# Altium footprint library kalios.PcbLib: 404 footprints (part 24 of 26)
Each footprint in its own frame and in the unit in brackets; x right, y up, seen from the top. Pads: shape width x height; smd on the part's side, far side on the other; paste and mask are expansions set on the pad; w line width, h text height; cw(c..) or ccw(c..) is an arc to the next point about the centre after c.
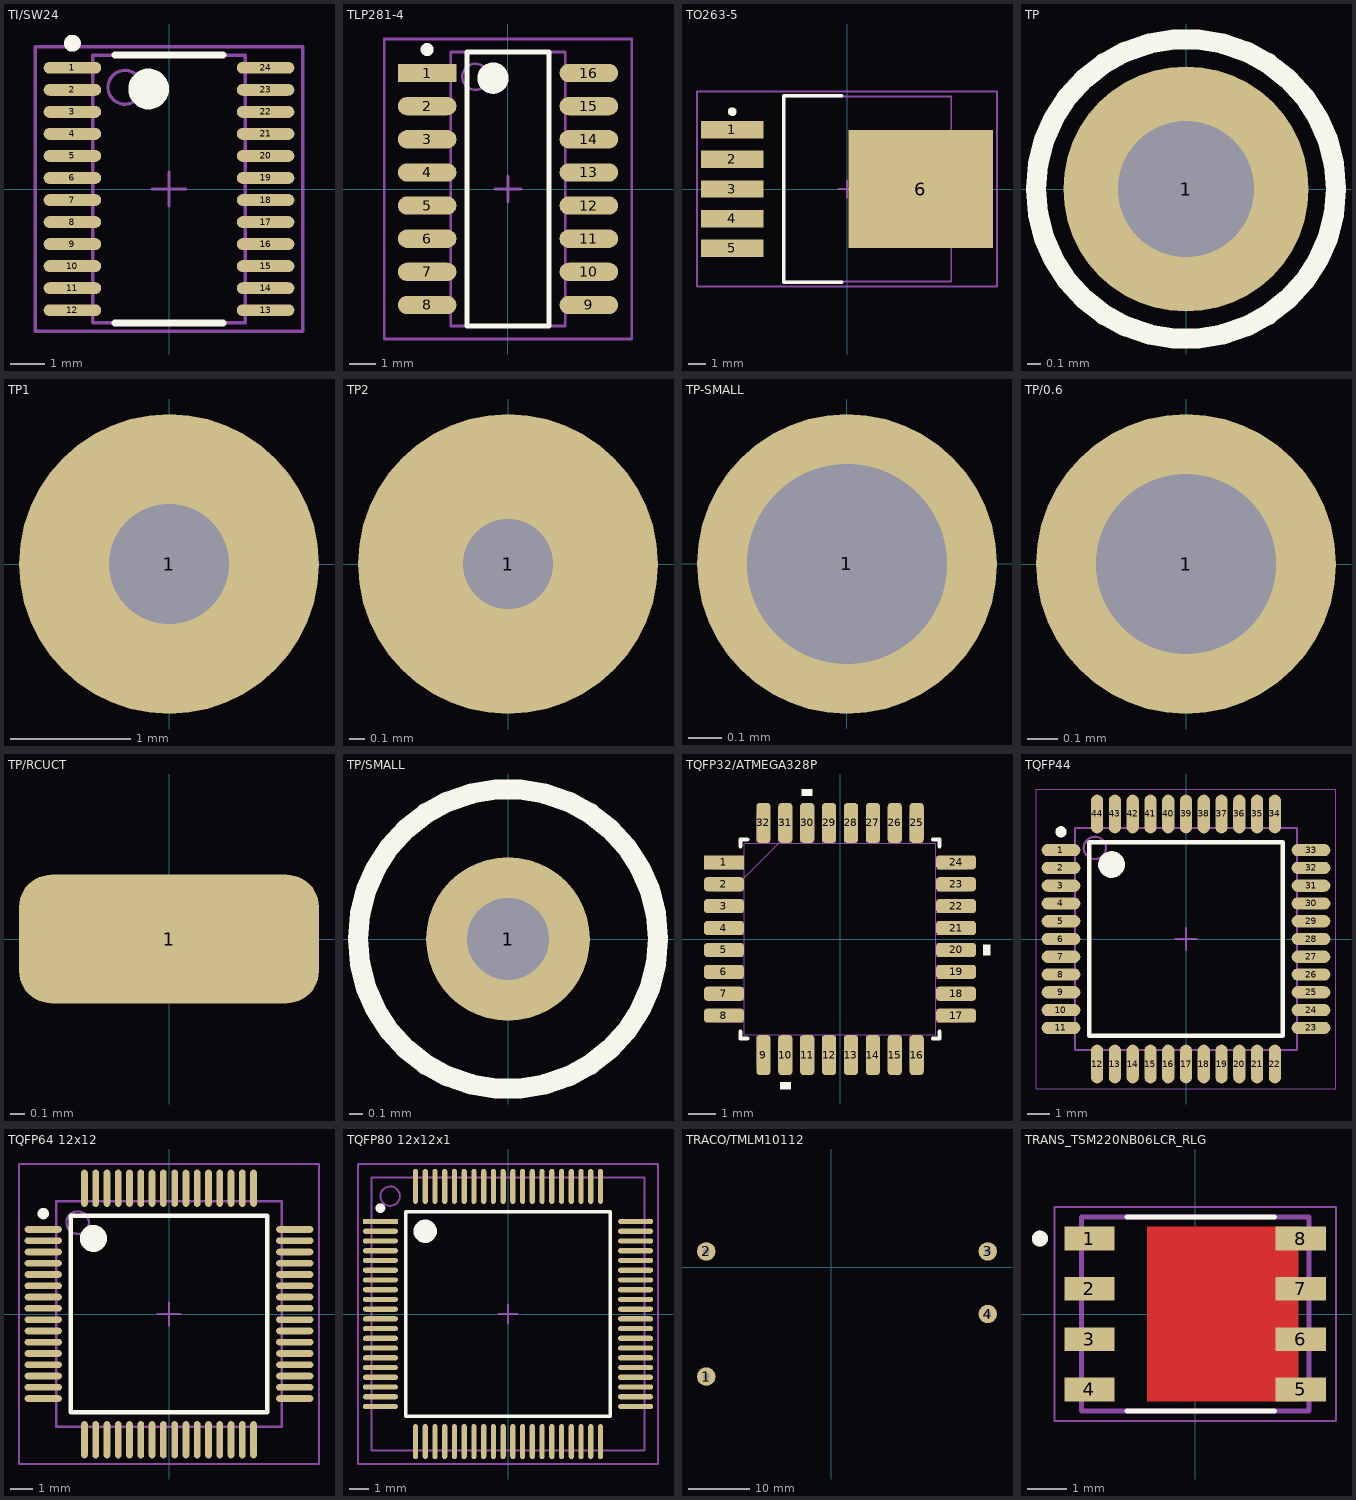
[diagram p23: the footprints below, top view; thin cyan lines are the x and y axes]

## TI/SW24 [mm] "TSOP, 24-Leads, Body 7.9x4.5mm (max), Pitch 0.65mm, IPC Medium Density"
height 1.2
pads (24):
  oval 1.7x0.35 smd: 1(-2.85,3.575) 2(-2.85,2.925) 3(-2.85,2.275) 4(-2.85,1.625) 5(-2.85,0.975) 6(-2.85,0.325) 7(-2.85,-0.325) 8(-2.85,-0.975) 9(-2.85,-1.625) 10(-2.85,-2.275) 11(-2.85,-2.925) 12(-2.85,-3.575) 13(2.85,-3.575) 14(2.85,-2.925) 15(2.85,-2.275) 16(2.85,-1.625) 17(2.85,-0.975) 18(2.85,-0.325) 19(2.85,0.325) 20(2.85,0.975) 21(2.85,1.625) 22(2.85,2.275) 23(2.85,2.925) 24(2.85,3.575)
Top Overlay:
  circle w0.25: c-2.85,4.3 r0.125
  circle w0.6: c-0.6,2.95 r0.3
  lines w0.2: -1.6,-3.95 1.6,-3.95 ; -1.6,3.95 1.6,3.95
Top 3D Body:
  circle w0.1: c-1.3,3 r0.5
  lines w0.1: -2.25,-3.95 -2.25,3.95 2.25,3.95 2.25,-3.95 -2.25,-3.95
Top Courtyard:
  lines w0.1: -0.5,0 0.5,0 ; 0,-0.5 0,0.5 ; -3.95,-4.2 -3.95,4.2 3.95,4.2 3.95,-4.2 -3.95,-4.2
Top Designator:
  text ".Designator" at -7.618,-0.358 h1.52
3D body "User Library-AD8400 TSSOP.STEP": height 1.18, standoff 0, extent -3.2,-3.953 3.207,3.937

## TLP281-4 [mm] "SOIC, 16-Leads, Body 10.5x4.4mm (max), Pitch 1.27mm, IPC Low Density"
height 2
pads (16):
  rect 2.25x0.7 smd: 1(-3.1,4.445)
  oval 2.25x0.7 smd: 2(-3.1,3.175) 3(-3.1,1.905) 4(-3.1,0.635) 5(-3.1,-0.635) 6(-3.1,-1.905) 7(-3.1,-3.175) 8(-3.1,-4.445) 9(3.1,-4.445) 10(3.1,-3.175) 11(3.1,-1.905) 12(3.1,-0.635) 13(3.1,0.635) 14(3.1,1.905) 15(3.1,3.175) 16(3.1,4.445)
Top Overlay:
  circle w0.6: c-0.575,4.25 r0.3
  circle w0.25: c-3.1,5.345 r0.125
  lines w0.2: -1.575,-5.25 1.575,-5.25 1.575,5.25 -1.575,5.25 -1.575,-5.25
Top 3D Body:
  circle w0.1: c-1.25,4.3 r0.5
  lines w0.1: -2.2,-5.25 2.2,-5.25 2.2,5.25 -2.2,5.25 -2.2,-5.25
Top Courtyard:
  lines w0.1: -0.5,0 0.5,0 ; 0,-0.5 0,0.5 ; -4.75,-5.75 4.75,-5.75 4.75,5.75 -4.75,5.75 -4.75,-5.75
Top Designator:
  text ".Designator" at -7.618,-0.508 h1.52
3D body "TLP281-4.STEP": height 1.9, standoff 0, extent -3.45,-5.15 3.55,5.15

## TO263-5 [mm] "D2PAK, 6-Pads, Body 9.6x10.7mm (max), IPC Medium Density"
height 0.58
pads (6):
  rect 3.6x1 smd: 1(-6.6,3.4) 2(-6.6,1.7) 3(-6.6,0) 4(-6.6,-1.7) 5(-6.6,-3.4)
  rect 8.3x6.8 smd: 6(4.25,0)
Top Overlay:
  circle w0.25: c-6.6,4.45 r0.125
  lines w0.2: -0.3,-5.35 -3.65,-5.35 -3.65,5.35 -0.3,5.35
Top 3D Body:
  lines w0.1: -3.65,-5.325 -3.65,5.325 6,5.325 6,-5.325 -3.65,-5.325
Top Courtyard:
  lines w0.1: -0.5,0 0.5,0 ; 0,-0.5 0,0.5 ; -8.625,-5.6 -8.625,5.6 8.625,5.6 8.625,-5.6 -8.625,-5.6
Top Designator:
  text ".Designator" at -7.618,-0.508 h1.52
3D body "TO263-5.STEP": height 4.78, standoff -0.02, extent -8.063,-5 7.607,5

## TP [mm]
pads (1):
  round 1.8 hole 1: 1(0,0)
Top Overlay:
  circle w0.15: c0,0 r1.1
Top Designator:
  text ".Designator" at -7.618,-0.508 h1.52

## TP1 [mm]
pads (1):
  round 2.5 hole 1: 1(0,0)
Top Designator:
  text ".Designator" at -7.618,-0.508 h1.52

## TP2 [mm]
pads (1):
  round 2 hole 0.6: 1(0,0)
Top Designator:
  text ".Designator" at -7.618,-0.508 h1.52

## TP-SMALL [mm]
pads (1):
  round 0.9 hole 0.6: 1(0,0)
Top Designator:
  text ".Designator" at -7.618,-0.508 h1.52

## TP/0.6 [mm]
pads (1):
  round 1 hole 0.6: 1(0,0)
Top Designator:
  text ".Designator" at -7.618,-0.508 h1.52

## TP/RCUCT [mm]
pads (1):
  rrect50% 2.1x0.9 smd: 1(0,0)
3D body "RCU.STEP": height 1.15, standoff 0, extent -0.8,-0.4 0.8,0.4

## TP/SMALL [mm]
pads (1):
  round 1.2 hole 0.6: 1(0,0)
Top Overlay:
  circle w0.15: c0,0 r1.1
Top Designator:
  text ".Designator" at -7.618,-0.508 h1.52

## TQFP32/ATMEGA328P [mm]
pads (32):
  rect 1.462x0.517 smd: 1(-4.242,2.8)
  rrect50% 1.462x0.517 smd: 2(-4.242,2) 3(-4.242,1.2) 4(-4.242,0.4) 5(-4.242,-0.4) 6(-4.242,-1.2) 7(-4.242,-2) 8(-4.242,-2.8) 17(4.242,-2.8) 18(4.242,-2) 19(4.242,-1.2) 20(4.242,-0.4) 21(4.242,0.4) 22(4.242,1.2) 23(4.242,2) 24(4.242,2.8)
  rrect50% 0.517x1.462 smd: 9(-2.8,-4.242) 10(-2,-4.242) 11(-1.2,-4.242) 12(-0.4,-4.242) 13(0.4,-4.242) 14(1.2,-4.242) 15(2,-4.242) 16(2.8,-4.242) 25(2.8,4.242) 26(2,4.242) 27(1.2,4.242) 28(0.4,4.242) 29(-0.4,4.242) 30(-1.2,4.242) 31(-2,4.242) 32(-2.8,4.242)
Top Overlay:
  region: -1.81,-5.227 -2.191,-5.227 -2.191,-5.481 -1.81,-5.481
  region: 5.227,-0.209 5.481,-0.209 5.481,-0.59 5.227,-0.59
  region: -1.01,5.227 -1.391,5.227 -1.391,5.481 -1.01,5.481
  lines w0.152: -3.632,-3.391 -3.632,-3.632 -3.391,-3.632 ; -3.632,3.391 -3.632,3.632 -3.391,3.632 ; 3.391,-3.632 3.632,-3.632 3.632,-3.391 ; 3.391,3.632 3.632,3.632 3.632,3.391
Top 3D Body:
  lines w0.025: -3.505,2.235 -2.235,3.505 ; -4.623,-3.029 -4.623,-2.571 -3.505,-2.571 -3.505,-3.029 -4.623,-3.029 ; -4.623,-2.229 -4.623,-1.771 -3.505,-1.771 -3.505,-2.229 -4.623,-2.229 ; -4.623,-1.429 -4.623,-0.971 -3.505,-0.971 -3.505,-1.429 -4.623,-1.429 ; -4.623,-0.629 -4.623,-0.171 -3.505,-0.171 -3.505,-0.629 -4.623,-0.629 ; -4.623,0.171 -4.623,0.629 -3.505,0.629 -3.505,0.171 -4.623,0.171 ; -4.623,0.971 -4.623,1.429 -3.505,1.429 -3.505,0.971 -4.623,0.971 ; -4.623,1.771 -4.623,2.229 -3.505,2.229 -3.505,1.771 -4.623,1.771 ; -4.623,2.571 -4.623,3.029 -3.505,3.029 -3.505,2.571 -4.623,2.571 ; -3.505,-3.505 3.505,-3.505 3.505,3.505 -3.505,3.505 -3.505,-3.505 ; -3.029,-4.623 -3.029,-3.505 -2.571,-3.505 -2.571,-4.623 -3.029,-4.623 ; -3.029,3.505 -2.571,3.505 -2.571,4.623 -3.029,4.623 -3.029,3.505 ; -2.229,-4.623 -2.229,-3.505 -1.771,-3.505 -1.771,-4.623 -2.229,-4.623 ; -2.229,3.505 -1.771,3.505 -1.771,4.623 -2.229,4.623 -2.229,3.505 ; -1.429,-4.623 -1.429,-3.505 -0.971,-3.505 -0.971,-4.623 -1.429,-4.623 ; -1.429,3.505 -0.971,3.505 -0.971,4.623 -1.429,4.623 -1.429,3.505 ; -0.629,-4.623 -0.629,-3.505 -0.171,-3.505 -0.171,-4.623 -0.629,-4.623 ; -0.629,3.505 -0.171,3.505 -0.171,4.623 -0.629,4.623 -0.629,3.505 ; 0.171,-4.623 0.171,-3.505 0.629,-3.505 0.629,-4.623 0.171,-4.623 ; 0.171,3.505 0.629,3.505 0.629,4.623 0.171,4.623 0.171,3.505 ; 0.971,-4.623 0.971,-3.505 1.429,-3.505 1.429,-4.623 0.971,-4.623 ; 0.971,3.505 1.429,3.505 1.429,4.623 0.971,4.623 0.971,3.505 ; 1.771,-4.623 1.771,-3.505 2.229,-3.505 2.229,-4.623 1.771,-4.623 ; 1.771,3.505 2.229,3.505 2.229,4.623 1.771,4.623 1.771,3.505 ; 2.571,-4.623 2.571,-3.505 3.029,-3.505 3.029,-4.623 2.571,-4.623 ; 2.571,3.505 3.029,3.505 3.029,4.623 2.571,4.623 2.571,3.505 ; 3.505,-3.029 3.505,-2.571 4.623,-2.571 4.623,-3.029 3.505,-3.029 ; 3.505,-2.229 3.505,-1.771 4.623,-1.771 4.623,-2.229 3.505,-2.229 ; 3.505,-1.429 3.505,-0.971 4.623,-0.971 4.623,-1.429 3.505,-1.429 ; 3.505,-0.629 3.505,-0.171 4.623,-0.171 4.623,-0.629 3.505,-0.629 ; 3.505,0.171 3.505,0.629 4.623,0.629 4.623,0.171 3.505,0.171 ; 3.505,0.971 3.505,1.429 4.623,1.429 4.623,0.971 3.505,0.971 ; 3.505,1.771 3.505,2.229 4.623,2.229 4.623,1.771 3.505,1.771 ; 3.505,2.571 3.505,3.029 4.623,3.029 4.623,2.571 3.505,2.571
Top Designator:
  text ".Designator" at -7.414,-0.508 h1.52
3D body "tqfp32.STEP": height 1.11, standoff 0, extent -4.794,-4.806 4.806,4.794

## TQFP44 [mm] "TQFP, 44-Leads, Body 10.00x10.00mm, Pitch 0.80mm, IPC Medium Density"
height 1.2
pads (44):
  oval 1.75x0.55 smd: 1(-5.625,4) 2(-5.625,3.2) 3(-5.625,2.4) 4(-5.625,1.6) 5(-5.625,0.8) 6(-5.625,0) 7(-5.625,-0.8) 8(-5.625,-1.6) 9(-5.625,-2.4) 10(-5.625,-3.2) 11(-5.625,-4) 23(5.625,-4) 24(5.625,-3.2) 25(5.625,-2.4) 26(5.625,-1.6) 27(5.625,-0.8) 28(5.625,0) 29(5.625,0.8) 30(5.625,1.6) 31(5.625,2.4) 32(5.625,3.2) 33(5.625,4)
  oval 0.55x1.75 smd: 12(-4,-5.625) 13(-3.2,-5.625) 14(-2.4,-5.625) 15(-1.6,-5.625) 16(-0.8,-5.625) 17(0,-5.625) 18(0.8,-5.625) 19(1.6,-5.625) 20(2.4,-5.625) 21(3.2,-5.625) 22(4,-5.625) 34(4,5.625) 35(3.2,5.625) 36(2.4,5.625) 37(1.6,5.625) 38(0.8,5.625) 39(0,5.625) 40(-0.8,5.625) 41(-1.6,5.625) 42(-2.4,5.625) 43(-3.2,5.625) 44(-4,5.625)
Top Overlay:
  circle w0.6: c-3.35,3.35 r0.3
  circle w0.25: c-5.625,4.825 r0.125
  lines w0.2: -4.35,-4.35 4.35,-4.35 4.35,4.35 -4.35,4.35 -4.35,-4.35
Top 3D Body:
  circle w0.1: c-4.1,4.1 r0.5
  lines w0.1: -5,-5 5,-5 5,5 -5,5 -5,-5
Top Courtyard:
  lines w0.05: -6.75,-6.75 6.75,-6.75 6.75,6.75 -6.75,6.75 -6.75,-6.75
  lines w0.1: -0.5,0 0.5,0 ; 0,-0.5 0,0.5
Top Designator:
  text ".Designator" at -7.618,-0.508 h1.52
3D body "User Library-TQFP44-2 (1).STEP": height 1.1, standoff -0.05, extent -6.012,-6.012 6.012,6.012

## TQFP64 12x12 [mm] "TSQFP, 64-Leads, Body 12.0x12.0mm (max), Pitch 0.50mm, IPC Medium Density"
height 1.2
pads (64):
  oval 1.65x0.3 smd: 1(-5.575,3.75) 2(-5.575,3.25) 3(-5.575,2.75) 4(-5.575,2.25) 5(-5.575,1.75) 6(-5.575,1.25) 7(-5.575,0.75) 8(-5.575,0.25) 9(-5.575,-0.25) 10(-5.575,-0.75) 11(-5.575,-1.25) 12(-5.575,-1.75) 13(-5.575,-2.25) 14(-5.575,-2.75) 15(-5.575,-3.25) 16(-5.575,-3.75) 33(5.575,-3.75) 34(5.575,-3.25) 35(5.575,-2.75) 36(5.575,-2.25) 37(5.575,-1.75) 38(5.575,-1.25) 39(5.575,-0.75) 40(5.575,-0.25) 41(5.575,0.25) 42(5.575,0.75) 43(5.575,1.25) 44(5.575,1.75) 45(5.575,2.25) 46(5.575,2.75) 47(5.575,3.25) 48(5.575,3.75)
  oval 0.3x1.65 smd: 17(-3.75,-5.575) 18(-3.25,-5.575) 19(-2.75,-5.575) 20(-2.25,-5.575) 21(-1.75,-5.575) 22(-1.25,-5.575) 23(-0.75,-5.575) 24(-0.25,-5.575) 25(0.25,-5.575) 26(0.75,-5.575) 27(1.25,-5.575) 28(1.75,-5.575) 29(2.25,-5.575) 30(2.75,-5.575) 31(3.25,-5.575) 32(3.75,-5.575) 49(3.75,5.575) 50(3.25,5.575) 51(2.75,5.575) 52(2.25,5.575) 53(1.75,5.575) 54(1.25,5.575) 55(0.75,5.575) 56(0.25,5.575) 57(-0.25,5.575) 58(-0.75,5.575) 59(-1.25,5.575) 60(-1.75,5.575) 61(-2.25,5.575) 62(-2.75,5.575) 63(-3.25,5.575) 64(-3.75,5.575)
Top Overlay:
  circle w0.25: c-5.575,4.45 r0.125
  circle w0.6: c-3.35,3.35 r0.3
  lines w0.2: -4.35,-4.35 -4.35,4.35 4.35,4.35 4.35,-4.35 -4.35,-4.35
Top 3D Body:
  circle w0.1: c-4.05,4.05 r0.5
  lines w0.1: -5,-5 -5,5 5,5 5,-5 -5,-5
Top Courtyard:
  lines w0.1: -0.5,0 0.5,0 ; 0,-0.5 0,0.5 ; -6.65,-6.65 -6.65,6.65 6.65,6.65 6.65,-6.65 -6.65,-6.65
Top Designator:
  text ".Designator" at -7.618,-0.508 h1.52
3D body "User Library-TQFP-64-1.STEP": height 1.05, standoff -0.01, extent -6,-6 6,6

## TQFP80 12x12x1 [mm] "TQFP, 80-Leads, Body 14x14mm, Pitch 0.50mm, IPC Medium Density"
height 1.1
pads (80):
  rect 1.8x0.27 smd: 1(-6.55,4.75)
  oval 1.8x0.27 smd: 2(-6.55,4.25) 3(-6.55,3.75) 4(-6.55,3.25) 5(-6.55,2.75) 6(-6.55,2.25) 7(-6.55,1.75) 8(-6.55,1.25) 9(-6.55,0.75) 10(-6.55,0.25) 11(-6.55,-0.25) 12(-6.55,-0.75) 13(-6.55,-1.25) 14(-6.55,-1.75) 15(-6.55,-2.25) 16(-6.55,-2.75) 17(-6.55,-3.25) 18(-6.55,-3.75) 19(-6.55,-4.25) 20(-6.55,-4.75) 41(6.55,-4.75) 42(6.55,-4.25) 43(6.55,-3.75) 44(6.55,-3.25) 45(6.55,-2.75) 46(6.55,-2.25) 47(6.55,-1.75) 48(6.55,-1.25) 49(6.55,-0.75) 50(6.55,-0.25) 51(6.55,0.25) 52(6.55,0.75) 53(6.55,1.25) 54(6.55,1.75) 55(6.55,2.25) 56(6.55,2.75) 57(6.55,3.25) 58(6.55,3.75) 59(6.55,4.25) 60(6.55,4.75)
  oval 0.27x1.8 smd: 21(-4.75,-6.55) 22(-4.25,-6.55) 23(-3.75,-6.55) 24(-3.25,-6.55) 25(-2.75,-6.55) 26(-2.25,-6.55) 27(-1.75,-6.55) 28(-1.25,-6.55) 29(-0.75,-6.55) 30(-0.25,-6.55) 31(0.25,-6.55) 32(0.75,-6.55) 33(1.25,-6.55) 34(1.75,-6.55) 35(2.25,-6.55) 36(2.75,-6.55) 37(3.25,-6.55) 38(3.75,-6.55) 39(4.25,-6.55) 40(4.75,-6.55) 61(4.75,6.55) 62(4.25,6.55) 63(3.75,6.55) 64(3.25,6.55) 65(2.75,6.55) 66(2.25,6.55) 67(1.75,6.55) 68(1.25,6.55) 69(0.75,6.55) 70(0.25,6.55) 71(-0.25,6.55) 72(-0.75,6.55) 73(-1.25,6.55) 74(-1.75,6.55) 75(-2.25,6.55) 76(-2.75,6.55) 77(-3.25,6.55) 78(-3.75,6.55) 79(-4.25,6.55) 80(-4.75,6.55)
Top Overlay:
  circle w0.25: c-6.55,5.435 r0.125
  circle w0.6: c-4.25,4.25 r0.3
  lines w0.2: -5.25,-5.25 -5.25,5.25 5.25,5.25 5.25,-5.25 -5.25,-5.25
Top 3D Body:
  circle w0.1: c-6.05,6.05 r0.5
  lines w0.1: -7,-7 -7,7 7,7 7,-7 -7,-7
Top Courtyard:
  lines w0.1: -0.5,0 0.5,0 ; 0,-0.5 0,0.5 ; -7.7,-7.7 -7.7,7.7 7.7,7.7 7.7,-7.7 -7.7,-7.7
Top Designator:
  text ".Designator" at -7.618,-0.508 h1.52
3D body "TQFP80 12x12 0.50 Pitch.STEP": height 1.05, standoff -0.05, extent -7.005,-6.999 7.005,7.01

## TRACO/TMLM10112 [mm]
pads (4):
  round 3 hole 1.1: 1(-20.32,-17.78) 2(-20.32,2.54) 3(25.4,2.54) 4(25.4,-7.62)
Top Designator:
  text ".Designator" at -5.077,-8.128 h1.52
3D body "TMLM10112.STEP": height 23.51, standoff -8, extent -23.56,-21.22 28.64,5.98

## TRANS_TSM220NB06LCR_RLG [mm]
pads (8):
  rect 1.27x0.6 smd: 1(-2.67,1.905) 2(-2.67,0.635) 3(-2.67,-0.635) 4(-2.67,-1.905) 5(2.67,-1.905) 6(2.67,-0.635) 7(2.67,0.635) 8(2.67,1.905)
Top Layer:
  rectangle: -1.219,-2.21 2.616,2.21
Top Overlay:
  circle w0.2: c-3.92,1.905 r0.1
  lines w0.127: -1.715,-2.45 2,-2.45 ; -1.715,2.45 2,2.45
Top Paste:
  region: 0.235,-2.073 -0.965,-2.073 -0.965,-0.823 0.235,-0.823
  region: 1.718,-2.083 0.518,-2.083 0.518,-0.833 1.718,-0.833
  region: 1.743,0.787 0.543,0.787 0.543,2.037 1.743,2.037
  region: 0.203,0.772 -0.997,0.772 -0.997,2.022 0.203,2.022
Top Solder:
  rectangle: -1.27,-2.261 2.667,2.261
Top 3D Body:
  circle w0.2: c-3.92,1.905 r0.1
  lines w0.127: -2.875,-2.45 2.875,-2.45 2.875,2.45 -2.875,2.45 -2.875,-2.45
Top Courtyard:
  lines w0.05: -3.555,-2.7 3.56,-2.7 3.56,2.7 -3.555,2.7 -3.555,-2.7
3D body "step_temp.STEP": height 1.1, standoff 0, extent -3,-2.45 3,2.45